# Altium footprint library Power_PCB.PcbLib: 52 footprints (part 2 of 4)
Each footprint in its own frame and in the unit in brackets; x right, y up, seen from the top. Pads: shape width x height; smd on the part's side, far side on the other; paste and mask are expansions set on the pad; w line width, h text height; cw(c..) or ccw(c..) is an arc to the next point about the centre after c.
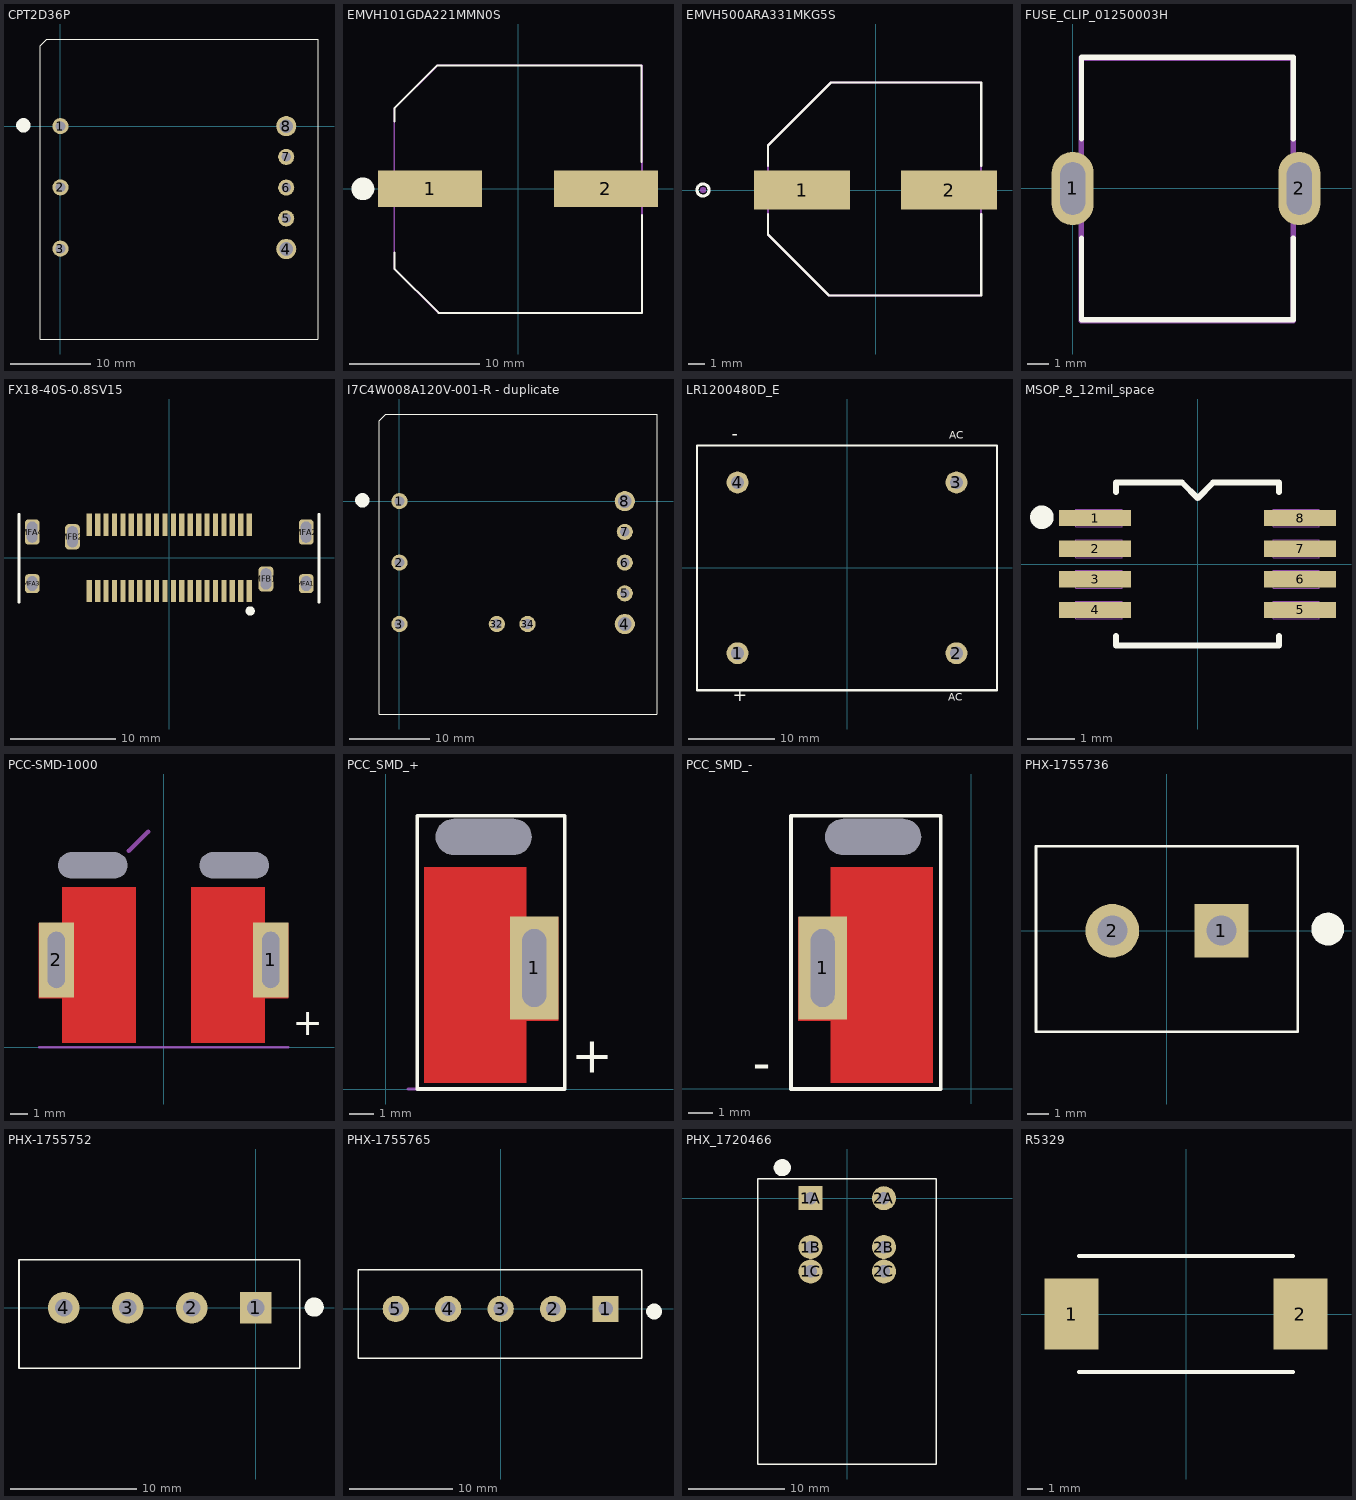
[diagram p1: the footprints below, top view; thin cyan lines are the x and y axes]

## CPT2D36P [mm] "DC DC CONVERTER 72W"
pads (8):
  round 2 hole 1.2 mask+0: 1(0,0) 2(0,-7.6) 3(0,-15.2) 5(28,-11.43) 6(28,-7.62) 7(28,-3.81)
  round 2.5 hole 1.7 mask+0: 4(28,-15.24) 8(28,0)
Top Overlay:
  circle w1.016: c-4.6,0.1 r0.381
  lines w0.152: -2.531,-26.4 -2.531,9.969 -1.695,10.805 31.9,10.805 31.9,-26.4 -2.531,-26.4
3D body "I7C4W008A120V-001-R--3DModel-STEP-1.STEP": height 12.09, standoff -4.57, extent -2.54,-26.086 31.496,10.744

## EMVH101GDA221MMN0S [mm]
pads (2):
  rect 8x2.8 smd: 1(-6.75,0) 2(6.75,0)
Top Overlay:
  circle w1: c-11.913,0 r0.376
  lines w0.152: -9.5,-4.877 -9.5,-6.121 -6.096,-9.525 9.525,-9.525 9.525,-2.007 ; -9.5,5.182 -9.5,6.172 -6.198,9.474 9.5,9.474 9.5,2.057
Mechanical 13:
  circle w0.2: c-11.506,0.025 r0.1
  lines w0.127: -9.5,-6.147 -9.5,6.172 -6.172,9.5 9.525,9.5 9.525,-9.525 -6.121,-9.525 -9.5,-6.147
3D body: height 3, standoff 0, extent -9.525,-9.525 9.525,9.5
3D body: height 21.5, standoff 0, extent -9.025,-9.022 8.975,8.972

## EMVH500ARA331MKG5S [mm]
pads (2):
  rect 6x2.42 smd: 1(-4.6,0) 2(4.6,0)
Top Overlay:
  circle w0.2: c-10.8,0 r0.376
  lines w0.152: -6.731,-1.53 -6.731,-2.794 -2.921,-6.604 6.604,-6.604 6.604,-1.53 ; -6.731,1.53 -6.731,2.794 -2.794,6.731 6.604,6.731 6.604,1.53
Mechanical 13:
  circle w0.2: c-10.8,0 r0.1
  lines w0.127: -6.731,-2.794 -2.921,-6.604 6.604,-6.604 6.604,6.731 -2.794,6.731 -6.731,2.794 -6.731,-2.794
3D body "CAP_EEFK_H13_PAN.step": height 14.05, standoff 0, extent -7.506,-6.819 7.506,6.871

## FUSE_CLIP_01250003H [mm]
pads (2):
  oval 2x3.5 hole 1.2 slot 2.5 at 90 deg: 1(0,0) 2(10.8,0)
Top Overlay:
  lines w0.254: 0.416,-2.362 0.416,-6.25 10.516,-6.25 10.516,-2.362 ; 0.416,2.362 0.416,6.25 10.516,6.25 10.516,2.362
Mechanical 15:
  lines w0.254: 0.413,-6.301 0.413,6.199 10.513,6.199 10.513,-6.301 0.413,-6.301 ; 0.413,-6.275 0.413,6.225 10.513,6.225 10.513,-6.275 0.413,-6.275
3D body: height 18.5, standoff 0, extent 0.406,-6.249 10.541,-3.208
3D body: height 3.5, standoff 0, extent 0.406,-6.248 10.516,6.248
3D body: height 18.5, standoff 0, extent 0.415,3.211 10.516,6.249

## FX18-40S-0.8SV15 [mm] "CONN RCPT 40POS SMD GOLD"
pads (46):
  rect 0.5x2.1 smd: 1(7.6,-3.15) 2(6.8,-3.15) 3(6,-3.15) 4(5.2,-3.15) 5(4.4,-3.15) 6(3.6,-3.15) 7(2.8,-3.15) 8(2,-3.15) 9(1.2,-3.15) 10(0.4,-3.15) 11(-0.4,-3.15) 12(-1.2,-3.15) 13(-2,-3.15) 14(-2.8,-3.15) 15(-3.6,-3.15) 16(-4.4,-3.15) 17(-5.2,-3.15) 18(-6,-3.15) 19(-6.8,-3.15) 20(-7.6,-3.15) 21(7.6,3.15) 22(6.8,3.15) 23(6,3.15) 24(5.2,3.15) 25(4.4,3.15) 26(3.6,3.15) 27(2.8,3.15) 28(2,3.15) 29(1.2,3.15) 30(0.4,3.15) 31(-0.4,3.15) 32(-1.2,3.15) 33(-2,3.15) 34(-2.8,3.15) 35(-3.6,3.15) 36(-4.4,3.15) 37(-5.2,3.15) 38(-6,3.15) 39(-6.8,3.15) 40(-7.6,3.15)
  rrect50% 1.4x1.8 hole 1.4 slot 1 at 0 deg: MFA1(13.025,-2.45) MFA3(-13.025,-2.45)
  rrect50% 1.4x2.4 hole 2 slot 1 at 0 deg: MFA2(13.025,2.45) MFA4(-13.025,2.45) MFB1(9.2,-2) MFB2(-9.2,2)
Top Overlay:
  circle w0.254: c7.7,-5.05 r0.1
  circle w0.254: c7.7,-5.05 r0.316
  lines w0.254: -14.28,-4.223 -14.28,4.159 ; 14.244,-4.223 14.244,4.159
3D body "FX18-40S-0.8SV15.stp": height 11.83, standoff -1.27, extent -13.95,-3.95 13.95,3.85

## I7C4W008A120V-001-R - duplicate [mm] "DC DC CONVERTER 9.6-48V 300W"
pads (10):
  round 2 hole 1.2 mask+0: 1(0,0) 2(0,-7.62) 3(0,-15.24) 5(27.94,-11.43) 6(27.94,-7.62) 7(27.94,-3.81) 32(12.07,-15.24) 34(15.88,-15.24)
  round 2.5 hole 1.7 mask+0: 4(27.94,-15.24) 8(27.94,0)
Top Overlay:
  circle w1.016: c-4.6,0.1 r0.381
  lines w0.152: -2.531,-26.4 -2.531,9.969 -1.695,10.805 31.9,10.805 31.9,-26.4 -2.531,-26.4
3D body "I7C4W008A120V-001-R--3DModel-STEP-1.STEP": height 12.09, standoff -4.57, extent -2.5,-26.03 31.536,10.8

## LR1200480D_E [mil] "SSR RELAY SPST-NO"
pads (4):
  round 100 hole 60: 1(-500,-390) 2(500,-390) 3(500,390) 4(-500,390)
Top Overlay:
  lines w10: -685.04,-559.06 -685.04,559.06 685.04,559.06 685.04,-559.06 -685.04,-559.06
  text "+" at -521,-629 h100
  text "-" at -526,564 h100
  text "AC" at 467,578 h60
  text "AC" at 463,-618 h60
Mechanical 4:
  text "AC" at 456.69,251.97 h60
  text "-" at -539,225 h100
  text "AC" at 448.82,-314.96 h60
  text "INPUT" at -472.44,-145.67 h60
  text "OUTPUT" at 515.75,-165.35 h60
  text "+" at -533,-307 h100
3D body "100801.step": height 382, standoff -105, extent -685,-560 684.99,560

## MSOP_8_12mil_space [mil]
pads (8):
  rect 60x13.59 smd paste+0 mask+0: 1(-85.5,38.39) 2(-85.5,12.8) 3(-85.5,-12.8) 4(-85.5,-38.39) 5(85.5,-38.39) 6(85.5,-12.8) 7(85.5,12.8) 8(85.5,38.39)
Top Overlay:
  circle w9.84: c-129.92,39 r4.92
  lines w5: -68,-59.99 -68,-68 68,-68 68,-59.99 ; -68,59.99 -68,68 -13,68 0,55 13,68 68,68 68,59.99
Mechanical 13:
  lines w1: -101.5,-45.89 -101.5,-30.89 -63,-30.89 -63,-45.89 -101.5,-45.89 ; -101.5,-20.3 -101.5,-5.3 -63,-5.3 -63,-20.3 -101.5,-20.3 ; -101.5,5.3 -101.5,20.3 -63,20.3 -63,5.3 -101.5,5.3 ; -101.5,30.89 -101.5,45.89 -63,45.89 -63,30.89 -101.5,30.89 ; 63,-45.89 63,-30.89 101.5,-30.89 101.5,-45.89 63,-45.89 ; 63,-20.3 63,-5.3 101.5,-5.3 101.5,-20.3 63,-20.3 ; 63,5.3 63,20.3 101.5,20.3 101.5,5.3 63,5.3 ; 63,30.89 63,45.89 101.5,45.89 101.5,30.89 63,30.89
3D body "RM_8_ADI.step": height 43.11, standoff 0, extent -101.49,-62.99 101.5,63

## PCC-SMD-1000 [mm] "The PCC-SMD connector from Omega is perfect for bringing thermocouple"
pads (4):
  rect 2.032x4.318 hole 1 slot 3.25 at 90 deg: 1(6.2,5.05) 2(-6.2,5.05)
  rect 0x0 hole 1.5 slot 4 at 0 deg unplated paste-4 mask+0: 3(-4.09,10.52) 4(4.09,10.52)
Top Layer:
  region: 1.6,9.246 1.6,0.254 5.867,0.254 5.867,2.84 7.21,2.84 7.21,7.16 5.867,7.16 5.867,9.246
  region: -5.867,9.246 -1.6,9.246 -1.6,0.254 -5.867,0.254 -5.867,2.84 -7.21,2.84 -7.21,7.16 -5.867,7.16
Top Overlay:
  text "+" at 7.468,0.686 h1.52
Route Tool Path:
  lines w0.127: -7.21,0 7.21,0
  lines w0.254: -2.007,11.354 -0.889,12.471
  text "R: 15.74mil (0.4mm) all" at -0.508,12.421 h1.02
  text "board edge" at 7.518,0 h1.02
3D body: height 2.4, standoff 0, extent 1.626,-0.686 6.68,11.227
3D body: height 2.4, standoff 0, extent -6.68,-0.66 -1.626,11.227

## PCC_SMD_+ [mm] "Thermocouple connector"
height 2.286
pads (2):
  rect 2.032x4.318 hole 1 slot 3.25 at 90 deg: 1(6.2,5.05)
  rect 0x0 hole 1.5 slot 4 at 0 deg unplated paste-4 mask+0: 4(4.09,10.52)
Top Layer:
  region: 1.6,9.246 1.6,0.254 5.867,0.254 5.867,2.84 7.21,2.84 7.21,7.16 5.867,7.16 5.867,9.246
Top Overlay:
  lines w0.152: 1.321,11.379 1.321,0 7.468,0 7.468,11.405 1.321,11.405
  text "+" at 7.747,0.686 h1.52
Route Tool Path:
  lines w0.127: 0.94,0 7.21,0
  text "board edge" at 7.518,0 h1.02
  text "R: 15.74mil (0.4mm) all" at 7.341,12.573 h1.02
3D body: height 2.4, standoff 0, extent 1.626,-0.686 6.68,11.227

## PCC_SMD_- [mm] "Thermocouple connector"
height 2.286
pads (2):
  rect 2.032x4.318 hole 1 slot 3.25 at 90 deg: 1(-6.2,5.05)
  rect 0x0 hole 1.5 slot 4 at 0 deg unplated paste-4 mask+0: 3(-4.09,10.52)
Top Layer:
  region: -5.867,9.246 -1.6,9.246 -1.6,0.254 -5.867,0.254 -5.867,2.84 -7.21,2.84 -7.21,7.16 -5.867,7.16
Top Overlay:
  lines w0.152: -7.518,0 -7.518,11.405 -1.27,11.405 -1.27,0 -7.518,0
  text "-" at -9.119,0.356 h1.52
Route Tool Path:
  lines w0.127: -7.214,0 -1.245,0
  text "R: 15.74mil (0.4mm) all" at -0.229,12.725 h1.02
  text "board edge" at -0.965,-0.254 h1.02
3D body: height 2.4, standoff 0, extent -6.68,-0.66 -1.626,11.227

## PHX-1755736 [mm] "TERM BLOCK HDR 2POS VERT 5.08MM"
pads (2):
  rect 2.5x2.5 hole 1.397 mask+0: 1(2.54,0)
  round 2.5 hole 1.397 mask+0: 2(-2.54,0)
Top Overlay:
  circle w0.762: c7.493,0.076 r0.381
  lines w0.127: -6.096,-4.699 6.096,-4.699 6.096,3.927 -6.096,3.927 -6.096,-4.699
3D body "1755736--3DModel-STEP-56544.STEP": height 12.15, standoff -4.1, extent -6.08,-4.666 6.08,3.904

## PHX-1755752 [mm] "TERM BLOCK HDR 4POS VERT 5.08MM"
pads (4):
  rect 2.5x2.5 hole 1.397 mask+0: 1(0,0)
  round 2.5 hole 1.397 mask+0: 2(-5.08,0) 3(-10.16,0) 4(-15.24,0)
Top Overlay:
  circle w0.762: c4.648,0.051 r0.381
  lines w0.127: -18.796,-4.801 -18.796,3.81 ; -18.787,-4.801 3.515,-4.801 3.515,3.81 -18.787,3.81
3D body "pxc_1755752_04_MSTBVA-2-5-4-G-5-08_3D.stp": height 12, standoff -3.9, extent -18.796,-4.79 3.524,3.81

## PHX-1755765 [mil] "TERM BLOCK HDR 5POS VERT 5.08MM"
pads (5):
  rect 100x100 / inner round 75 / far side round 75 hole 55 mask+0: 1(400,0)
  round 100 / inner round 75 / far side round 75 hole 55 mask+0: 2(200,0) 3(0,0) 4(-200,0) 5(-400,0)
Top Overlay:
  circle w30: c585,-10 r15
  lines w5: -544,-189 -544,150 538.37,150 538.37,-189 -544,-189
3D body "pxc_1755765_04_MSTBVA-2-5-5-G-5-08_3D.stp": height 472.44, standoff -153.54, extent -540.37,-188.79 538.37,149.79

## PHX_1720466 [mm]
pads (6):
  rect 2.5x2.5 hole 1.3 mask+0: 1A(-3.81,0)
  round 2.5 hole 1.3 mask+0: 1B(-3.81,-5.08) 1C(-3.81,-7.62) 2A(3.81,0) 2B(3.81,-5.08) 2C(3.81,-7.62)
Top Overlay:
  circle w1.016: c-6.756,3.175 r0.381
  lines w0.152: -9.322,-27.635 -9.322,2.032 9.271,2.032 9.271,-27.635 -9.322,-27.635
3D body "pxc_1720466_03_PC-5-2-G-7-62_3D.stp": height 15.12, standoff -4.09, extent -9.04,-27.462 9,1.788

## R5329 [mm]
pads (2):
  rect 3.4x4.5 smd: 1(-7.2,0) 2(7.2,0)
Top Overlay:
  lines w0.254: -6.75,-3.65 6.75,-3.65 ; -6.75,3.65 6.75,3.65
3D body "c-8-1879233-9-ba-3d.stp": height 6.9, standoff 0.1, extent -6.91,-3.65 6.71,3.65